# Altium footprint library Cyberdeck.PcbLib: 261 footprints (part 14 of 17)
Each footprint in its own frame and in the unit in brackets; x right, y up, seen from the top. Pads: shape width x height; smd on the part's side, far side on the other; paste and mask are expansions set on the pad; w line width, h text height; cw(c..) or ccw(c..) is an arc to the next point about the centre after c.
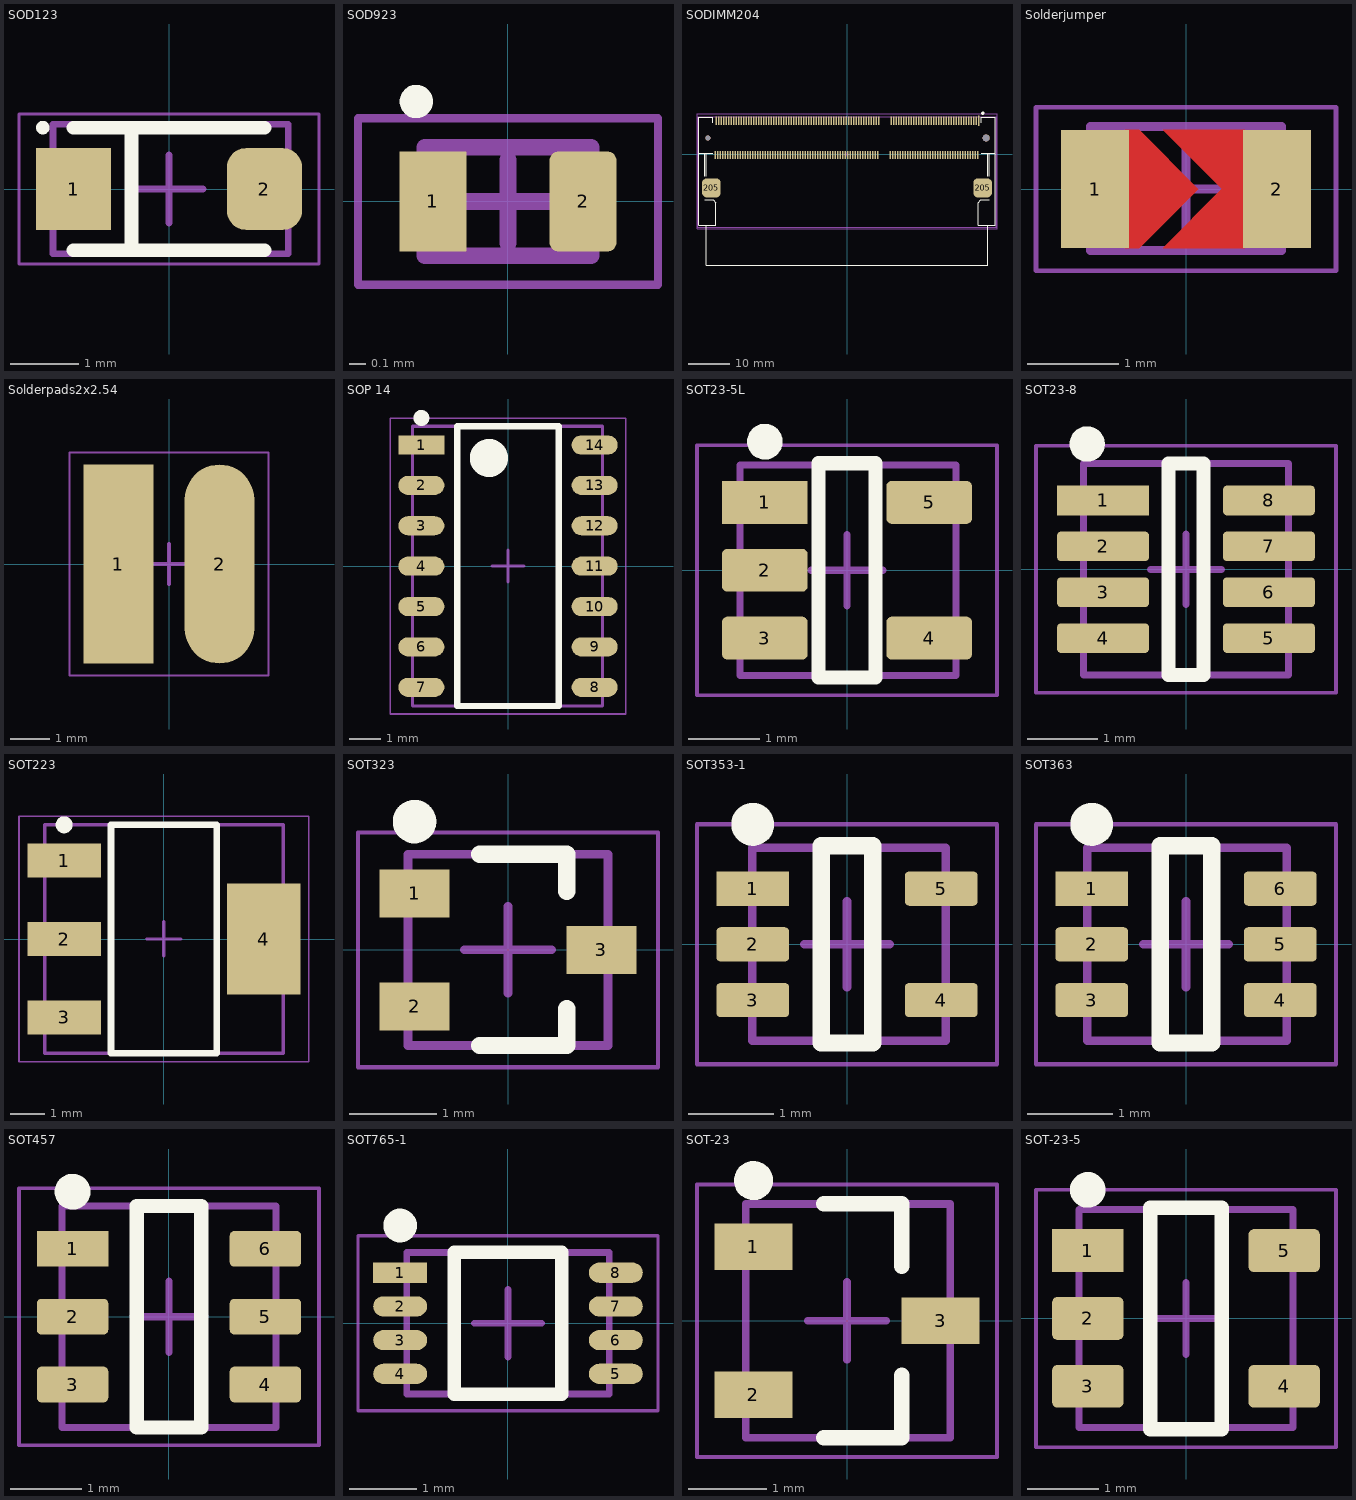
[diagram p13: the footprints below, top view; thin cyan lines are the x and y axes]

## SOD123 [mm] "SODFL, 2-Leads, Body 1.70x3.50mm, IPC Medium Density"
height 1.1
pads (2):
  rect 1.1x1.2 smd: 1(-1.4,0)
  rrect50% 1.1x1.2 smd: 2(1.4,0)
Top Overlay:
  circle w0.1: c-1.85,0.9 r0.05
  lines w0.2: -1.4,-0.9 1.4,-0.9 ; -1.4,0.9 1.4,0.9 ; -0.55,-0.9 -0.55,0.9
Assembly Top:
  lines w0.1: -1.7,-0.95 -1.7,0.95 1.75,0.95 1.75,-0.95 -1.7,-0.95
Courtyard Top:
  lines w0.05: -2.2,-1.1 -2.2,1.1 2.2,1.1 2.2,-1.1 -2.2,-1.1
  lines w0.1: -0.5,0 0.5,0 ; 0,-0.5 0,0.5
3D body "SOD123.step": height 1.1, standoff 0, extent -1.75,-0.95 1.75,0.95

## SOD923 [mm] "SOD923"
height 0.4
pads (2):
  rect 0.4x0.6 smd: 1(-0.45,0)
  rrect25% 0.4x0.6 smd: 2(0.45,0)
Top Overlay:
  circle w0.1: c-0.55,0.6 r0.05
Assembly Top:
  lines w0.1: -0.5,-0.325 -0.5,0.325 0.5,0.325 0.5,-0.325 -0.5,-0.325
Courtyard Top:
  lines w0.05: -0.9,-0.5 -0.9,0.5 0.9,0.5 0.9,-0.5 -0.9,-0.5
  lines w0.1: -0.25,0 0.25,0 ; 0,-0.25 0,0.25
3D body "SODFL127P600-8N.step": height 0.4, standoff 0, extent -0.5,-0.325 0.5,0.325

## SODIMM204 [mm] "SODIMM204"
height 4
pads (208):
  rect 0.35x2.5 smd: 1(31.65,8.05)
  rrect50% 0.35x2 smd: 2(31.35,-0.15) 3(31.05,8.05) 4(30.75,-0.15) 5(30.45,8.05) 6(30.15,-0.15) 7(29.85,8.05) 8(29.55,-0.15) 9(29.25,8.05) 10(28.95,-0.15) 11(28.65,8.05) 12(28.35,-0.15) 13(28.05,8.05) 14(27.75,-0.15) 15(27.45,8.05) 16(27.15,-0.15) 17(26.85,8.05) 18(26.55,-0.15) 19(26.25,8.05) 20(25.95,-0.15) 21(25.65,8.05) 22(25.35,-0.15) 23(25.05,8.05) 24(24.75,-0.15) 25(24.45,8.05) 26(24.15,-0.15) 27(23.85,8.05) 28(23.55,-0.15) 29(23.25,8.05) 30(22.95,-0.15) 31(22.65,8.05) 32(22.35,-0.15) 33(22.05,8.05) 34(21.75,-0.15) 35(21.45,8.05) 36(21.15,-0.15) 37(20.85,8.05) 38(20.55,-0.15) 39(20.25,8.05) 40(19.95,-0.15) 41(19.65,8.05) 42(19.35,-0.15) 43(19.05,8.05) 44(18.75,-0.15) 45(18.45,8.05) 46(18.15,-0.15) 47(17.85,8.05) 48(17.55,-0.15) 49(17.25,8.05) 50(16.95,-0.15) 51(16.65,8.05) 52(16.35,-0.15) 53(16.05,8.05) 54(15.75,-0.15) 55(15.45,8.05) 56(15.15,-0.15) 57(14.85,8.05) 58(14.55,-0.15) 59(14.25,8.05) 60(13.95,-0.15) 61(13.65,8.05) 62(13.35,-0.15) 63(13.05,8.05) 64(12.75,-0.15) 65(12.45,8.05) 66(12.15,-0.15) 67(11.85,8.05) 68(11.55,-0.15) 69(11.25,8.05) 70(10.95,-0.15) 71(10.65,8.05) 72(10.35,-0.15) 73(7.65,8.05) 74(7.35,-0.15) 75(7.05,8.05) 76(6.75,-0.15) 77(6.45,8.05) 78(6.15,-0.15) 79(5.85,8.05) 80(5.55,-0.15) 81(5.25,8.05) 82(4.95,-0.15) 83(4.65,8.05) 84(4.35,-0.15) 85(4.05,8.05) 86(3.75,-0.15) 87(3.45,8.05) 88(3.15,-0.15) 89(2.85,8.05) 90(2.55,-0.15) 91(2.25,8.05) 92(1.95,-0.15) 93(1.65,8.05) 94(1.35,-0.15) 95(1.05,8.05) 96(0.75,-0.15) 97(0.45,8.05) 98(0.15,-0.15) 99(-0.15,8.05) 100(-0.45,-0.15) 101(-0.75,8.05) 102(-1.05,-0.15) 103(-1.35,8.05) 104(-1.65,-0.15) 105(-1.95,8.05) 106(-2.25,-0.15) 107(-2.55,8.05) 108(-2.85,-0.15) 109(-3.15,8.05) 110(-3.45,-0.15) 111(-3.75,8.05) 112(-4.05,-0.15) 113(-4.35,8.05) 114(-4.65,-0.15) 115(-4.95,8.05) 116(-5.25,-0.15) 117(-5.55,8.05) 118(-5.85,-0.15) 119(-6.15,8.05) 120(-6.45,-0.15) 121(-6.75,8.05) 122(-7.05,-0.15) 123(-7.35,8.05) 124(-7.65,-0.15) 125(-7.95,8.05) 126(-8.25,-0.15) 127(-8.55,8.05) 128(-8.85,-0.15) 129(-9.15,8.05) 130(-9.45,-0.15) 131(-9.75,8.05) 132(-10.05,-0.15) 133(-10.35,8.05) 134(-10.65,-0.15) 135(-10.95,8.05) 136(-11.25,-0.15) 137(-11.55,8.05) 138(-11.85,-0.15) 139(-12.15,8.05) 140(-12.45,-0.15) 141(-12.75,8.05) 142(-13.05,-0.15) 143(-13.35,8.05) 144(-13.65,-0.15) 145(-13.95,8.05) 146(-14.25,-0.15) 147(-14.55,8.05) 148(-14.85,-0.15) 149(-15.15,8.05) 150(-15.45,-0.15) 151(-15.75,8.05) 152(-16.05,-0.15) 153(-16.35,8.05) 154(-16.65,-0.15) 155(-16.95,8.05) 156(-17.25,-0.15) 157(-17.55,8.05) 158(-17.85,-0.15) 159(-18.15,8.05) 160(-18.45,-0.15) 161(-18.75,8.05) 162(-19.05,-0.15) 163(-19.35,8.05) 164(-19.65,-0.15) 165(-19.95,8.05) 166(-20.25,-0.15) 167(-20.55,8.05) 168(-20.85,-0.15) 169(-21.15,8.05) 170(-21.45,-0.15) 171(-21.75,8.05) 172(-22.05,-0.15) 173(-22.35,8.05) 174(-22.65,-0.15) 175(-22.95,8.05) 176(-23.25,-0.15) 177(-23.55,8.05) 178(-23.85,-0.15) 179(-24.15,8.05) 180(-24.45,-0.15) 181(-24.75,8.05) 182(-25.05,-0.15) 183(-25.35,8.05) 184(-25.65,-0.15) 185(-25.95,8.05) 186(-26.25,-0.15) 187(-26.55,8.05) 188(-26.85,-0.15) 189(-27.15,8.05) 190(-27.45,-0.15) 191(-27.75,8.05) 192(-28.05,-0.15) 193(-28.35,8.05) 194(-28.65,-0.15) 195(-28.95,8.05) 196(-29.25,-0.15) 197(-29.55,8.05) 198(-29.85,-0.15) 199(-30.15,8.05) 200(-30.45,-0.15) 201(-30.75,8.05) 202(-31.05,-0.15) 203(-31.35,8.05) 204(-31.65,-0.15)
  rrect50% 4.5x4.6 smd: 205(-32.55,-8.05) 205(32.55,-8.05)
  round 1.2 hole 1.2 unplated: 206(-33.4,3.95)
  round 1.7 hole 1.7 unplated: 206(33.4,3.95)
Top Overlay:
  circle w0.5: c32.6,9.9 r0.141
  lines w0.2: -34.1,-10.9 -32.15,-10.9 -31.5,-11.55 -31.5,-17.05 -35.6,-17.05 ; -34.1,-5.3 -34.1,0.25 ; -33.8,-5.3 -33.8,0.25 ; -33.782,-17.05 -33.782,-26.65 33.8,-26.65 33.8,-17.05 ; -32.9,-17.05 -35.6,-17.05 ; -32.2,0.25 -35.6,0.25 ; -32.2,7.65 -32.2,8.95 -35.6,8.95 -35.6,3.95 -35.6,0.25 ; 32.2,0.25 35.4,0.25 35.6,0.25 ; 32.2,7.65 32.2,8.95 35.6,8.95 35.6,3.95 35.6,0.25 ; 32.9,-17.05 35.6,-17.05 ; 33.8,-5.3 33.8,0.25 ; 34.1,-10.9 32.15,-10.9 31.5,-11.55 31.5,-17.05 35.6,-17.05 ; 34.1,-5.3 34.1,0.25 ; -35.6,-17.05 -35.6,0.25 ; 35.6,-17.05 35.6,0.25
Assembly Top:
  lines w0.1: 35.8,-17.54 35.8,9 ; 35.8,-17.54 35.8,-17.54 ; 35.8,-17.54 -35.8,-17.54 -35.8,9 35.8,9 ; 35.8,9 35.8,9
Courtyard Top:
  lines w0.05: -36,-17.8 -36,9.8 36,9.8 36,-17.8 -36,-17.8
  lines w0.1: -0.5,0 0.5,0 ; 0,-0.5 0,0.5
3D body "72r3762_2013289-1.stp": height 5.51, standoff -0.64, extent -35.8,-17.54 35.8,9

## Solderjumper [mm]
pads (2):
  rect 0.75x1.3 smd: 1(-1,0) 2(1,0)
Top Layer:
  region: -0.675,0.65 -0.513,0.65 0.137,0 -0.513,-0.65 -0.675,-0.65
  region: 0.648,0.002 0.394,0.002 -0.254,0.65 0.648,0.65
  region: 0.648,0.002 0.394,0.002 -0.258,-0.65 0.648,-0.65
Top Paste:
  region: 0.645,0 0.391,0 -0.259,-0.65 0.645,-0.65
  region: 0.645,0 0.391,0 -0.259,0.65 0.645,0.65
  region: -0.675,0.65 -0.513,0.65 0.137,0 -0.513,-0.65 -0.675,-0.65
Top Solder:
  region: 0.645,0 0.289,0 -0.461,0.75 0.645,0.75
  region: 0.645,0 0.289,0 -0.461,-0.75 0.645,-0.75
  region: -0.625,0.75 -0.511,0.75 0.239,0 -0.511,-0.75 -0.625,-0.75
Assembly Top:
  lines w0.1: -1.05,-0.675 1.05,-0.675 1.05,0.686 -1.05,0.686 -1.05,-0.675
Courtyard Top:
  lines w0.05: -1.65,-0.9 1.65,-0.9 1.65,0.9 -1.65,0.9 -1.65,-0.9
  lines w0.1: -0.5,0 0.5,0 ; 0,-0.5 0,0.5
3D body "RESC-0805.stp": height 0.6, standoff 0, extent -1.05,-0.675 1.05,0.675

## Solderpads2x2.54 [mm] "Solderpads2x2.54"
pads (2):
  rect 1.75x5 smd: 1(-1.27,0)
  oval 1.75x5 smd: 2(1.27,0)
Courtyard Top:
  lines w0.05: -2.5,-2.8 2.5,-2.8 2.5,2.8 -2.5,2.8 -2.5,-2.8
  lines w0.1: -0.5,0 0.5,0 ; 0,-0.5 0,0.5

## SOP 14 [mm] "SOIC, 14-Leads, Body 8.65x3.80mm, Pitch 1.27mm, IPC Medium Density"
height 1.75
pads (14):
  rect 1.45x0.6 smd: 1(-2.725,3.81)
  oval 1.45x0.6 smd: 2(-2.725,2.54) 3(-2.725,1.27) 4(-2.725,0) 5(-2.725,-1.27) 6(-2.725,-2.54) 7(-2.725,-3.81) 8(2.725,-3.81) 9(2.725,-2.54) 10(2.725,-1.27) 11(2.725,0) 12(2.725,1.27) 13(2.725,2.54) 14(2.725,3.81)
Top Overlay:
  circle w0.25: c-2.725,4.66 r0.125
  circle w0.6: c-0.6,3.4 r0.3
  lines w0.2: -1.6,-4.4 -1.6,4.4 1.6,4.4 1.6,-4.4 -1.6,-4.4
Assembly Top:
  lines w0.1: -3,-4.4 -3,4.4 2.975,4.4 2.975,-4.4 -3,-4.4
Courtyard Top:
  lines w0.05: -3.7,-4.65 -3.7,4.65 3.7,4.65 3.7,-4.65 -3.7,-4.65
  lines w0.1: -0.5,0 0.5,0 ; 0,-0.5 0,0.5
3D body "SOP 14.step": height 1.75, standoff 0, extent -3,-4.4 3,4.4

## SOT23-5L [mm] "SOT23-5L ST"
height 1.45
pads (5):
  rect 1.2x0.6 smd: 1(-1.15,0.95)
  rrect25% 1.2x0.6 smd: 2(-1.15,0) 3(-1.15,-0.95) 4(1.15,-0.95) 5(1.15,0.95)
Top Overlay:
  circle w0.25: c-1.15,1.8 r0.125
  lines w0.2: -0.4,-1.5 -0.4,1.5 0.4,1.5 0.4,-1.5 -0.4,-1.5
Assembly Top:
  lines w0.1: -1.5,-1.475 1.525,-1.475 1.525,1.475 -1.5,1.475 -1.5,-1.475
Courtyard Top:
  lines w0.05: -2.1,-1.75 2.1,-1.75 2.1,1.75 -2.1,1.75 -2.1,-1.75
  lines w0.1: -0.5,0 0.5,0 ; 0,-0.5 0,0.5
3D body "SOT23-5L.step": height 1.45, standoff 0, extent -1.5,-1.475 1.5,1.475

## SOT23-8 [mm] "TSOP, 8-Leads, Body 2.90x1.63mm, Pitch 0.65mm, IPC Medium Density"
height 1.45
pads (8):
  rect 1.3x0.42 smd: 1(-1.175,0.975)
  rrect25% 1.3x0.42 smd: 2(-1.175,0.325) 3(-1.175,-0.325) 4(-1.175,-0.975) 5(1.175,-0.975) 6(1.175,-0.325) 7(1.175,0.325) 8(1.175,0.975)
Top Overlay:
  circle w0.25: c-1.4,1.775 r0.125
  lines w0.2: -0.25,-1.5 0.25,-1.5 0.25,1.5 -0.25,1.5 -0.25,-1.5
Assembly Top:
  lines w0.1: -1.45,-1.5 1.45,-1.5 1.45,1.5 -1.45,1.5 -1.45,-1.5
Courtyard Top:
  lines w0.05: -2.125,-1.75 2.125,-1.75 2.125,1.75 -2.125,1.75 -2.125,-1.75
  lines w0.1: -0.5,0 0.5,0 ; 0,-0.5 0,0.5
3D body "SOT23-8.step": height 1.45, standoff 0, extent -1.45,-1.5 1.45,1.5

## SOT223 [mm] "SOT223, 4-Leads, Body 6.50x7.00mm (avg), Pitch 2.30mm, IPC Medium Density"
height 1.8
pads (4):
  rect 2.15x1 smd: 1(-2.925,2.3) 2(-2.925,0) 3(-2.925,-2.3)
  rect 2.15x3.25 smd: 4(2.925,0)
Top Overlay:
  circle w0.25: c-2.925,3.35 r0.125
  lines w0.2: -1.55,-3.35 -1.55,3.35 1.55,3.35 1.55,-3.35 -1.55,-3.35
Assembly Top:
  lines w0.1: -3.5,-3.35 -3.5,3.35 3.5,3.35 3.5,-3.35 -3.5,-3.35
Courtyard Top:
  lines w0.05: -4.25,-3.6 -4.25,3.6 4.25,3.6 4.25,-3.6 -4.25,-3.6
  lines w0.1: -0.5,0 0.5,0 ; 0,-0.5 0,0.5
3D body "SOT223.step": height 1.8, standoff 0, extent -3.5,-3.35 3.5,3.35

## SOT323 [mm]
height 1.1
pads (3):
  rect 0.8x0.55 smd: 1(-1.075,0.65) 2(-1.075,-0.65) 3(1.075,0)
Top Overlay:
  circle w0.25: c-1.075,1.475 r0.125
  lines w0.2: -0.325,-1.1 0.675,-1.1 0.675,-0.675 ; -0.325,1.1 0.675,1.1 0.675,0.675
Assembly Top:
  lines w0.1: -1.15,-1.1 -1.15,1.1 1.15,1.1 1.15,-1.1 -1.15,-1.1
Courtyard Top:
  lines w0.05: -1.725,-1.35 -1.725,1.35 1.725,1.35 1.725,-1.35 -1.725,-1.35
  lines w0.1: -0.5,0 0.5,0 ; 0,-0.5 0,0.5
3D body "SOT23127P600-8N.step": height 1.1, standoff 0, extent -1.15,-1.1 1.15,1.1

## SOT353-1 [mm] "SOT353-1"
height 1.1
pads (5):
  rect 0.85x0.4 smd: 1(-1.1,0.65)
  rrect25% 0.85x0.4 smd: 2(-1.1,0) 3(-1.1,-0.65) 4(1.1,-0.65) 5(1.1,0.65)
Top Overlay:
  circle w0.25: c-1.1,1.4 r0.125
  lines w0.2: -0.3,-1.15 0.3,-1.15 0.3,1.15 -0.3,1.15 -0.3,-1.15
Assembly Top:
  lines w0.1: -1.105,-1.125 -1.105,1.125 1.15,1.125 1.15,-1.125 -1.105,-1.125
Courtyard Top:
  lines w0.05: -1.75,-1.4 -1.75,1.4 1.75,1.4 1.75,-1.4 -1.75,-1.4
  lines w0.1: -0.5,0 0.5,0 ; 0,-0.5 0,0.5
3D body "SOT353-1.step": height 1.1, standoff 0, extent -1.105,-1.125 1.105,1.125

## SOT363 [mm] "SOT23, 6-Leads, Body 2.05x2.13mm, Pitch 0.65mm, IPC Medium Density"
height 1.1
pads (6):
  rect 0.85x0.4 smd: 1(-1.1,0.65)
  rrect25% 0.85x0.4 smd: 2(-1.1,0) 3(-1.1,-0.65) 4(1.1,-0.65) 5(1.1,0) 6(1.1,0.65)
Top Overlay:
  circle w0.25: c-1.1,1.4 r0.125
  lines w0.2: -0.3,-1.15 -0.3,1.15 0.3,1.15 0.3,-1.15 -0.3,-1.15
Assembly Top:
  lines w0.1: -1.15,-1.125 1.175,-1.125 1.175,1.125 -1.15,1.125 -1.15,-1.125
Courtyard Top:
  lines w0.05: -1.75,-1.4 1.75,-1.4 1.75,1.4 -1.75,1.4 -1.75,-1.4
  lines w0.1: -0.5,0 0.5,0 ; 0,-0.5 0,0.5
3D body "SOT363.step": height 1.1, standoff 0, extent -1.175,-1.125 1.175,1.125

## SOT457 [mm] "SOT457"
height 1.1
pads (6):
  rect 1x0.5 smd: 1(-1.35,0.95)
  rrect25% 1x0.5 smd: 2(-1.35,0) 3(-1.35,-0.95) 4(1.35,-0.95) 5(1.35,0) 6(1.35,0.95)
Top Overlay:
  circle w0.25: c-1.35,1.75 r0.125
  lines w0.2: -0.45,-1.55 -0.45,1.55 0.45,1.55 0.45,-1.55 -0.45,-1.55
Assembly Top:
  lines w0.1: -1.5,-1.55 1.5,-1.55 1.5,1.55 -1.5,1.55 -1.5,-1.55
Courtyard Top:
  lines w0.05: -2.1,-1.8 2.1,-1.8 2.1,1.8 -2.1,1.8 -2.1,-1.8
  lines w0.1: -0.5,0 0.5,0 ; 0,-0.5 0,0.5
3D body "SOT457.step": height 1.1, standoff 0, extent -1.5,-1.55 1.5,1.55

## SOT765-1 [mm] "TSSOP, 8-Leads, Body 2.00x2.30mm, Pitch 0.50mm, IPC Medium Density"
height 1
pads (8):
  rect 0.8x0.3 smd: 1(-1.6,0.75)
  oval 0.8x0.3 smd: 2(-1.6,0.25) 3(-1.6,-0.25) 4(-1.6,-0.75) 5(1.6,-0.75) 6(1.6,-0.25) 7(1.6,0.25) 8(1.6,0.75)
Top Overlay:
  circle w0.25: c-1.6,1.45 r0.125
  lines w0.2: -0.8,-1.05 -0.8,1.05 0.8,1.05 0.8,-1.05 -0.8,-1.05
Assembly Top:
  lines w0.1: -1.5,-1.05 -1.5,1.05 1.5,1.05 1.5,-1.05 -1.5,-1.05
Courtyard Top:
  lines w0.05: -2.225,-1.3 -2.225,1.3 2.225,1.3 2.225,-1.3 -2.225,-1.3
  lines w0.1: -0.5,0 0.5,0 ; 0,-0.5 0,0.5
3D body "SOT765-1.step": height 1, standoff 0, extent -1.549,-1.05 1.549,1.05

## SOT-23 [mm] "SOT23, 3-Leads, Body 2.90x2.45mm, Pitch 0.95mm, IPC Medium Density"
height 1.1
pads (3):
  rect 1x0.6 smd: 1(-1.2,0.95) 2(-1.2,-0.95) 3(1.2,0)
Top Overlay:
  circle w0.25: c-1.2,1.8 r0.125
  lines w0.2: -0.3,-1.5 0.7,-1.5 0.7,-0.7 ; -0.3,1.5 0.7,1.5 0.7,0.7
Assembly Top:
  lines w0.1: -1.3,-1.5 -1.3,1.5 1.325,1.5 1.325,-1.5 -1.3,-1.5
Courtyard Top:
  lines w0.05: -1.925,-1.75 -1.925,1.75 1.925,1.75 1.925,-1.75 -1.925,-1.75
  lines w0.1: -0.5,0 0.5,0 ; 0,-0.5 0,0.5
3D body "SOT-23.step": height 1.1, standoff 0, extent -1.3,-1.5 1.3,1.5

## SOT-23-5 [mm] "SOT-23-5"
height 1.45
pads (5):
  rect 1x0.6 smd: 1(-1.375,0.95)
  rrect25% 1x0.6 smd: 2(-1.375,0) 3(-1.375,-0.95) 4(1.375,-0.95) 5(1.375,0.95)
Top Overlay:
  circle w0.25: c-1.375,1.8 r0.125
  lines w0.2: -0.5,-1.55 0.5,-1.55 0.5,1.55 -0.5,1.55 -0.5,-1.55
Assembly Top:
  lines w0.1: -1.5,-1.525 -1.5,1.525 1.5,1.525 1.5,-1.525 -1.5,-1.525
Courtyard Top:
  lines w0.05: -2.1,-1.8 -2.1,1.8 2.1,1.8 2.1,-1.8 -2.1,-1.8
  lines w0.1: -0.5,0 0.5,0 ; 0,-0.5 0,0.5
3D body "SOT-23-5.step": height 1.45, standoff 0, extent -1.5,-1.525 1.5,1.525